# Altium footprint library ESKDPcbLib.PcbLib: 608 footprints (part 13 of 38)
Each footprint in its own frame and in the unit in brackets; x right, y up, seen from the top. Pads: shape width x height; smd on the part's side, far side on the other; paste and mask are expansions set on the pad; w line width, h text height; cw(c..) or ccw(c..) is an arc to the next point about the centre after c.
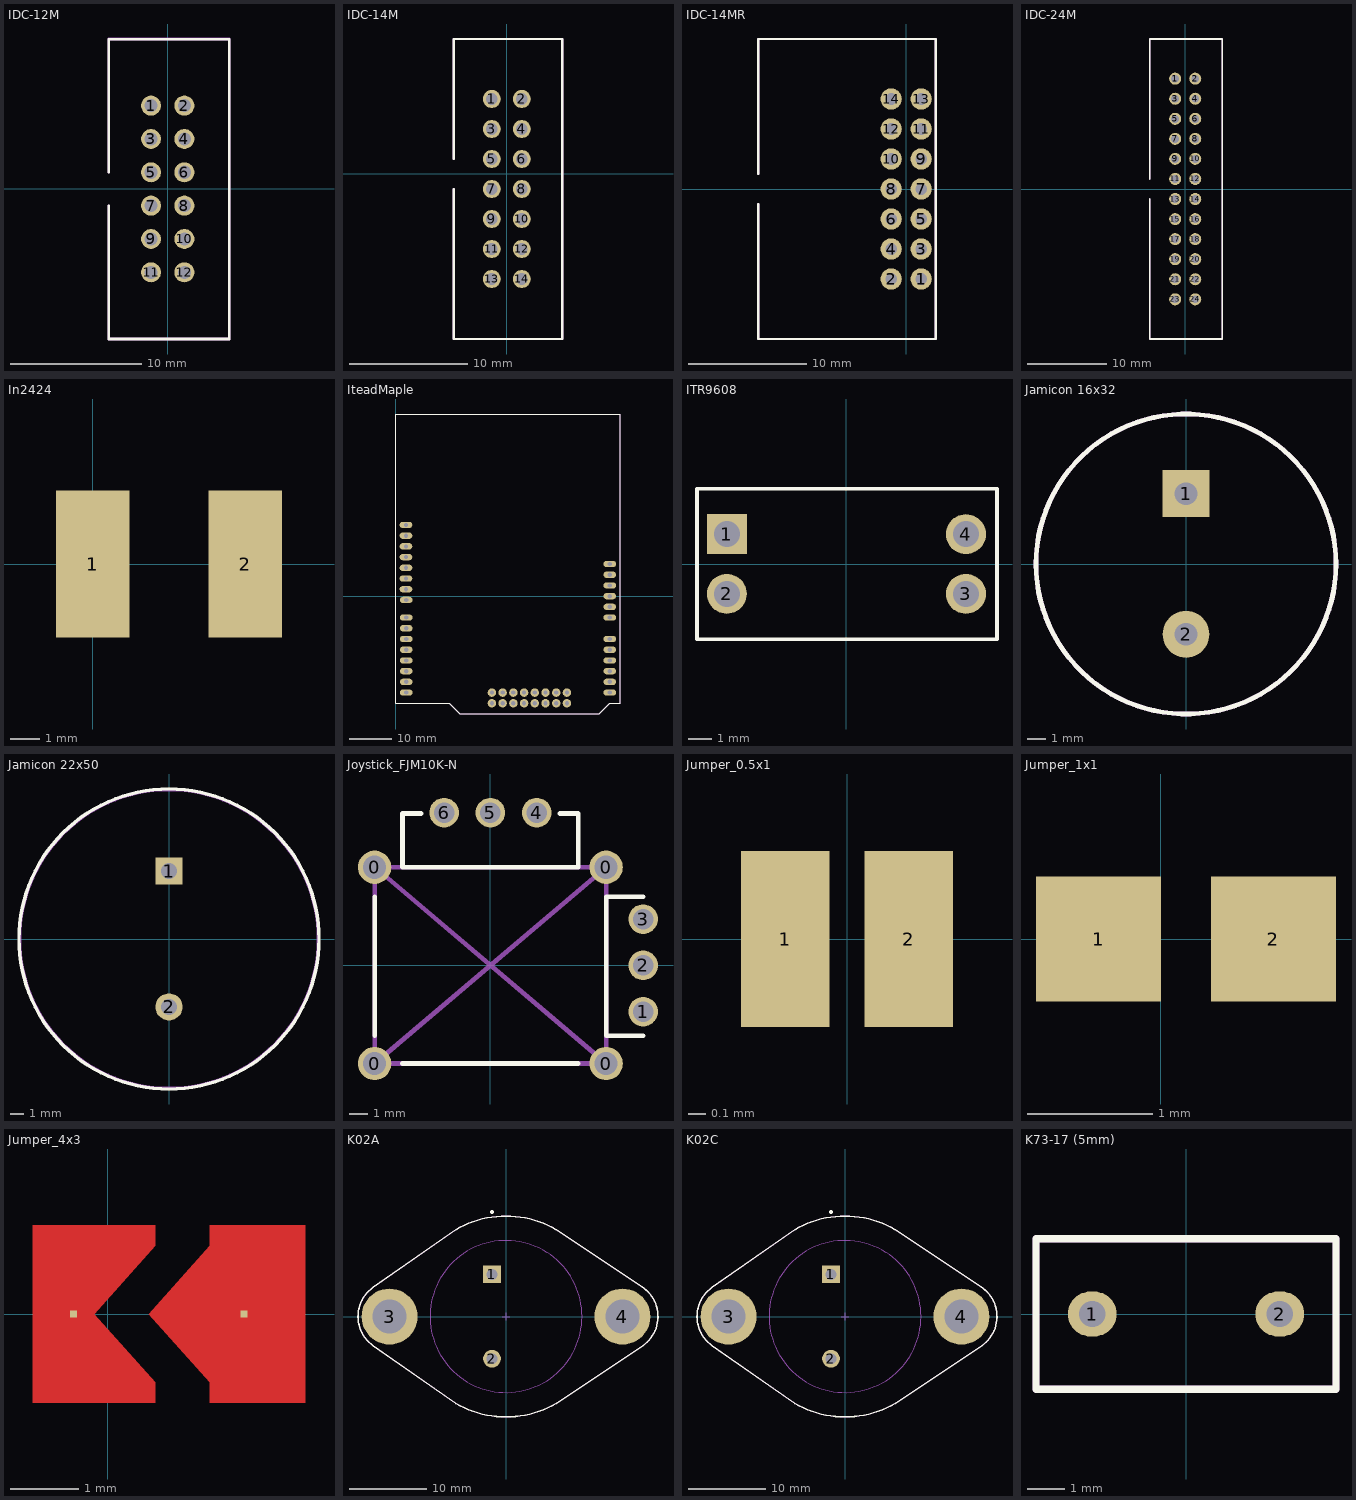
[diagram p12: the footprints below, top view; thin cyan lines are the x and y axes]

## IDC-12M [mil]
pads (12):
  round 60 hole 39.37: 1(-50,250) 2(50,250) 3(-50,150) 4(50,150) 5(-50,50) 6(50,50) 7(-50,-50) 8(50,-50) 9(-50,-150) 10(50,-150) 11(-50,-250) 12(50,-250)
Top Overlay:
  lines w7.87: -177.17,-50 -177.17,-450 185.04,-450 185.04,449.61 -177.17,449.61 -177.17,50
Mechanical 7:
  lines w7.87: -177.17,-50 -177.17,-450 185.04,-450 185.04,449.8 -177.17,449.8 -177.17,50
Mechanical 10:
  text ".Comment" at 0,500 h39.37
  text ".Designator" at 0,550 h39.37
3D body: height 350.39, standoff -125.98, extent -175,-450 183.27,450

## IDC-14M [mil]
pads (14):
  round 60 hole 39.37: 1(-50,250) 2(50,250) 3(-50,150) 4(50,150) 5(-50,50) 6(50,50) 7(-50,-50) 8(50,-50) 9(-50,-150) 10(50,-150) 11(-50,-250) 12(50,-250) 13(-50,-350) 14(50,-350)
Top Overlay:
  lines w7.87: -177.17,-50 -177.17,-550 185.04,-550 185.04,449.61 -177.17,449.61 -177.17,50
Mechanical 7:
  lines w7.87: -177.17,-50 -177.17,-550 185.04,-550 185.04,449.8 -177.17,449.8 -177.17,50
Mechanical 10:
  text ".Comment" at 0,500 h39.37
  text ".Designator" at 0,550 h39.37
3D body: height 366.14, standoff -122.05, extent -173.22,-549.61 185.05,449.61

## IDC-14MR [mm]
pads (14):
  round 1.8 hole 1: 1(1.27,-7.62) 2(-1.27,-7.62) 3(1.27,-5.08) 4(-1.27,-5.08) 5(1.27,-2.54) 6(-1.27,-2.54) 7(1.27,0) 8(-1.27,0) 9(1.27,2.54) 10(-1.27,2.54) 11(1.27,5.08) 12(-1.27,5.08) 13(1.27,7.62) 14(-1.27,7.62)
Top Overlay:
  lines w0.2: -12.522,-1.27 -12.522,-12.7 2.5,-12.7 2.5,12.7 -12.522,12.7 -12.522,1.27
Mechanical 7:
  lines w0.2: -12.522,-1.27 -12.522,-12.7 2.5,-12.7 2.5,12.7 -12.522,12.7 -12.522,1.27
Mechanical 10:
  text ".Designator" at 3,11.5 h1
  text ".Comment" at 3,10.5 h1

## IDC-24M [mil]
pads (24):
  round 60 hole 39.37: 1(-50,550) 2(50,550) 3(-50,450) 4(50,450) 5(-50,350) 6(50,350) 7(-50,250) 8(50,250) 9(-50,150) 10(50,150) 11(-50,50) 12(50,50) 13(-50,-50) 14(50,-50) 15(-50,-150) 16(50,-150) 17(-50,-250) 18(50,-250) 19(-50,-350) 20(50,-350) 21(-50,-450) 22(50,-450) 23(-50,-550) 24(50,-550)
Top Overlay:
  lines w7.87: -177.17,-50 -177.17,-748.03 185.04,-748.03 185.04,748.03 -177.17,748.03 -177.17,50
Mechanical 7:
  lines w7.87: -177.17,-50 -177.17,-748.03 185.04,-748.03 185.04,748.03 -177.17,748.03 -177.17,50
Mechanical 10:
  text ".Designator" at 118.11,826.77 h39.37
  text ".Comment" at 118.11,787.4 h39.37
3D body: height 350.39, standoff -125.98, extent -177.17,-750 181.1,750

## In2424 [mm]
pads (2):
  rect 2.5x5 smd: 1(0,0) 2(5.2,0)

## IteadMaple [mm]
pads (44):
  oval 3x1.5 hole 1: 1(2.48,16.876) 2(2.48,14.336) 3(2.48,11.796) 4(2.48,9.256) 5(2.48,6.716) 6(2.48,4.176) 7(2.48,1.636) 8(2.54,-0.889) 9(2.54,-5.08) 10(2.54,-7.62) 11(2.54,-10.16) 12(2.54,-12.7) 13(2.54,-15.24) 14(2.54,-17.78) 15(2.54,-20.32) 16(2.54,-22.86) 33(50.8,-22.86) 34(50.8,-20.32) 35(50.8,-17.78) 36(50.8,-15.24) 37(50.8,-12.7) 38(50.8,-10.16) 39(50.8,-5.08) 40(50.8,-2.54) 41(50.8,0) 42(50.8,2.54) 43(50.8,5.08) 44(50.8,7.62)
  round 2 hole 1: 17(22.86,-22.86) 18(22.86,-25.4) 19(25.4,-22.86) 20(25.4,-25.4) 21(27.94,-22.86) 22(27.94,-25.4) 23(30.48,-22.86) 24(30.48,-25.4) 25(33.02,-22.86) 26(33.02,-25.4) 27(35.56,-22.86) 28(35.56,-25.4) 29(38.1,-22.86) 30(38.1,-25.4) 31(40.64,-22.86) 32(40.64,-25.4)
Top Overlay:
  lines w0.254: 0,-25.4 12.7,-25.4 15.24,-27.94 48.26,-27.94 50.8,-25.4 53.34,-25.4 53.34,43.18 0,43.18 0,-25.4
Mechanical 7:
  lines w0.254: 0,-25.4 12.7,-25.4 15.24,-27.94 48.26,-27.94 50.8,-25.4 53.34,-25.4 53.34,-22.86 53.34,43.18 0,43.18 0,-22.86 0,-25.4
Mechanical 10:
  text ".Designator" at 4.62,45.86 h1
  text ".Comment" at 4.62,44.86 h1

## ITR9608 [mm]
pads (4):
  rect 1.7x1.7 hole 1.1: 1(-5.08,1.27)
  round 1.7 hole 1.1: 2(-5.08,-1.27) 3(5.08,-1.27) 4(5.08,1.27)
Top Overlay:
  lines w0.15: -6.35,-3.2 -6.35,3.2 6.4,3.2 6.4,-3.2 -6.35,-3.2
Mechanical 7:
  lines w0.1: -6.35,-3.2 -6.35,3.2 6.4,3.2 6.4,-3.2 -6.35,-3.2
3D body: height 7.1, standoff -4.4, extent -6.4,-3.2 6.4,3.2

## Jamicon 16x32 [mm]
pads (2):
  rect 2.5x2.5 hole 1.2: 1(0,3.75)
  round 2.5 hole 1.2: 2(0,-3.75)
Top Overlay:
  circle w0.254: c0,0 r8
Mechanical 7:
  circle w0.254: c0,0 r8
Mechanical 10:
  text ".Comment" at 1.025,8.65 h1.5
  text ".Designator" at 1.02,9.875 h1.5
3D body "JAMICON_TK_D(16)F(7_5)L(31_5).step": height 31.53, standoff -1.5, extent -8,-8.03 8,8

## Jamicon 22x50 [mm]
pads (2):
  rect 2x2 hole 1.2: 1(0,5)
  round 2 hole 1.2: 2(0,-5)
Top Overlay:
  circle w0.254: c0,0 r11.045
Mechanical 7:
  circle w0.254: c0,0 r11
Mechanical 10:
  text ".Comment" at 7.025,12.15 h1.5
  text ".Designator" at 7.02,13.375 h1.5
3D body "JAMICON_TK_D(22)F(10)L(50).STEP": height 50.03, standoff -1.5, extent -11,-11.03 11,11

## Joystick_FJM10K-N [mm]
pads (10):
  round 1.8 hole 1.25: 0(-6.25,-5.311) 0(-6.25,5.289) 0(6.25,-5.311) 0(6.25,5.289)
  round 1.6 hole 1.1: 1(8.25,-2.511) 2(8.25,-0.011) 3(8.25,2.489) 4(2.5,8.239) 5(0,8.239) 6(-2.5,8.239)
Top Overlay:
  lines w0.254: -6.25,-3.811 -6.25,3.689 ; -4.75,-5.311 4.75,-5.311 ; -3.75,8.189 -4.75,8.189 -4.75,5.289 4.75,5.289 4.75,8.189 3.75,8.189 ; 8.25,-3.811 6.25,-3.811 6.25,3.689 8.25,3.689
Mechanical 7:
  lines w0.254: -6.225,5.289 6.25,-5.311 ; -6.25,-5.311 6.25,-5.311 ; -6.25,-5.311 -6.25,5.289 6.25,5.289 ; -6.25,-5.311 6.25,5.289 ; 6.25,-5.311 6.25,5.289
3D body: height 18, standoff -3.7, extent -6.775,-6.536 10.275,10.264

## Jumper_0.5x1 [mm]
pads (2):
  rect 0.5x1 smd mask+0.1: 1(-0.35,0) 2(0.35,0)

## Jumper_1x1 [mm] "1x1"
pads (2):
  rect 1x1 smd mask+0.2: 1(-0.5,0) 2(0.9,0)

## Jumper_4x3 [mm] "4x3"
pads (2):
  rect 0.1x0.1 smd: 1(-0.5,0) 2(2,0)
Top Layer:
  region: -1.1,1.3 -1.1,-1.3 0.7,-1.3 0.7,-1 -0.2,0 0.7,1 0.7,1.3
  region: 1.5,1.3 1.5,1 0.6,0 1.5,-1 1.5,-1.3 2.9,-1.3 2.9,1.3
Top Solder:
  region: -1.3,1.5 -1.3,-1.5 3.1,-1.5 3.1,1.5

## K02A [mm] "Oval Flange Mount with (2) Offset Leads; Pin Spacing 10.93 mm; Lead Dia. 1.09 mm (max)"
height 8.94
pads (4):
  rect 2.3x2.3 hole 1.4: 1(-1.815,5.46)
  round 2.3 hole 1.4: 2(-1.815,-5.46)
  round 7.25 hole 4.4: 3(-15.075,0) 4(15.075,0)
Top Overlay:
  circle w0.25: c-1.815,13.53 r0.125
  lines w0.2: -17.2,-3.767 cw(c-14.561,0.001) -17.2,3.769 -6.5,11.258 cw(c0,0) 6.5,11.258 17.58,3.858 cw(c15.075,0) 17.713,-3.768 6.5,-11.258 cw(c0,0) -6.5,-11.258 -17.2,-3.767
Mechanical 13:
  circle w0.1: c0,0 r9.84
  lines w0.1: -17.2,-3.767 cw(c-14.561,0.001) -17.2,3.769 -6.5,11.258 cw(c0,0) 6.5,11.258 17.58,3.858 cw(c15.075,0) 17.713,-3.768 6.5,-11.258 cw(c0,0) -6.5,-11.258 -17.2,-3.767
Mechanical 15:
  lines w0.1: -0.5,0 0.5,0 ; 0,-0.5 0,0.5
3D body: height 8.94, standoff 1.77, extent -9.839,-9.839 9.839,9.839
3D body: height 1.77, standoff 0, extent -19.162,-13.001 19.676,13.001

## K02C [mm] "Oval Flange Mount with (2) Offset Leads; Pin Spacing 10.93 mm; Lead Dia. 1.09 mm (max)"
height 7.74
pads (4):
  rect 2.3x2.3 hole 1.4: 1(-1.815,5.46)
  round 2.3 hole 1.4: 2(-1.815,-5.46)
  round 7.25 hole 4.4: 3(-15.075,0) 4(15.075,0)
Top Overlay:
  circle w0.25: c-1.815,13.53 r0.125
  lines w0.2: -17.2,-3.767 cw(c-14.561,0.001) -17.2,3.769 -6.5,11.258 cw(c0,0) 6.5,11.258 17.58,3.858 cw(c15.075,0) 17.713,-3.768 6.5,-11.258 cw(c0,0) -6.5,-11.258 -17.2,-3.767
Mechanical 13:
  circle w0.1: c0,0 r9.84
  lines w0.1: -17.2,-3.767 cw(c-14.561,0.001) -17.2,3.769 -6.5,11.258 cw(c0,0) 6.5,11.258 17.58,3.858 cw(c15.075,0) 17.713,-3.768 6.5,-11.258 cw(c0,0) -6.5,-11.258 -17.2,-3.767
Mechanical 15:
  lines w0.1: -0.5,0 0.5,0 ; 0,-0.5 0,0.5
3D body: height 7.74, standoff 1.77, extent -9.839,-9.839 9.839,9.839
3D body: height 1.77, standoff 0, extent -19.162,-13.001 19.676,13.001

## K73-17 (5mm) [mm]
pads (2):
  oval 1.3x1.2 hole 0.7: 1(-2.5,0) 2(2.5,0)
Top Overlay:
  lines w0.2: -4,-2 -4,2 4,2 4,-2 -4,-2
Mechanical 7:
  lines w0.2: -4,-2 4,-2 4,2 -4,2 -4,-2
Mechanical 10:
  text ".Designator" at 0.4,2.4 h0.8
  text ".Comment" at 1,-3 h0.6